# Altium footprint library mmyLibrary.PcbLib: 231 footprints (part 2 of 15)
Each footprint in its own frame and in the unit in brackets; x right, y up, seen from the top. Pads: shape width x height; smd on the part's side, far side on the other; paste and mask are expansions set on the pad; w line width, h text height; cw(c..) or ccw(c..) is an arc to the next point about the centre after c.
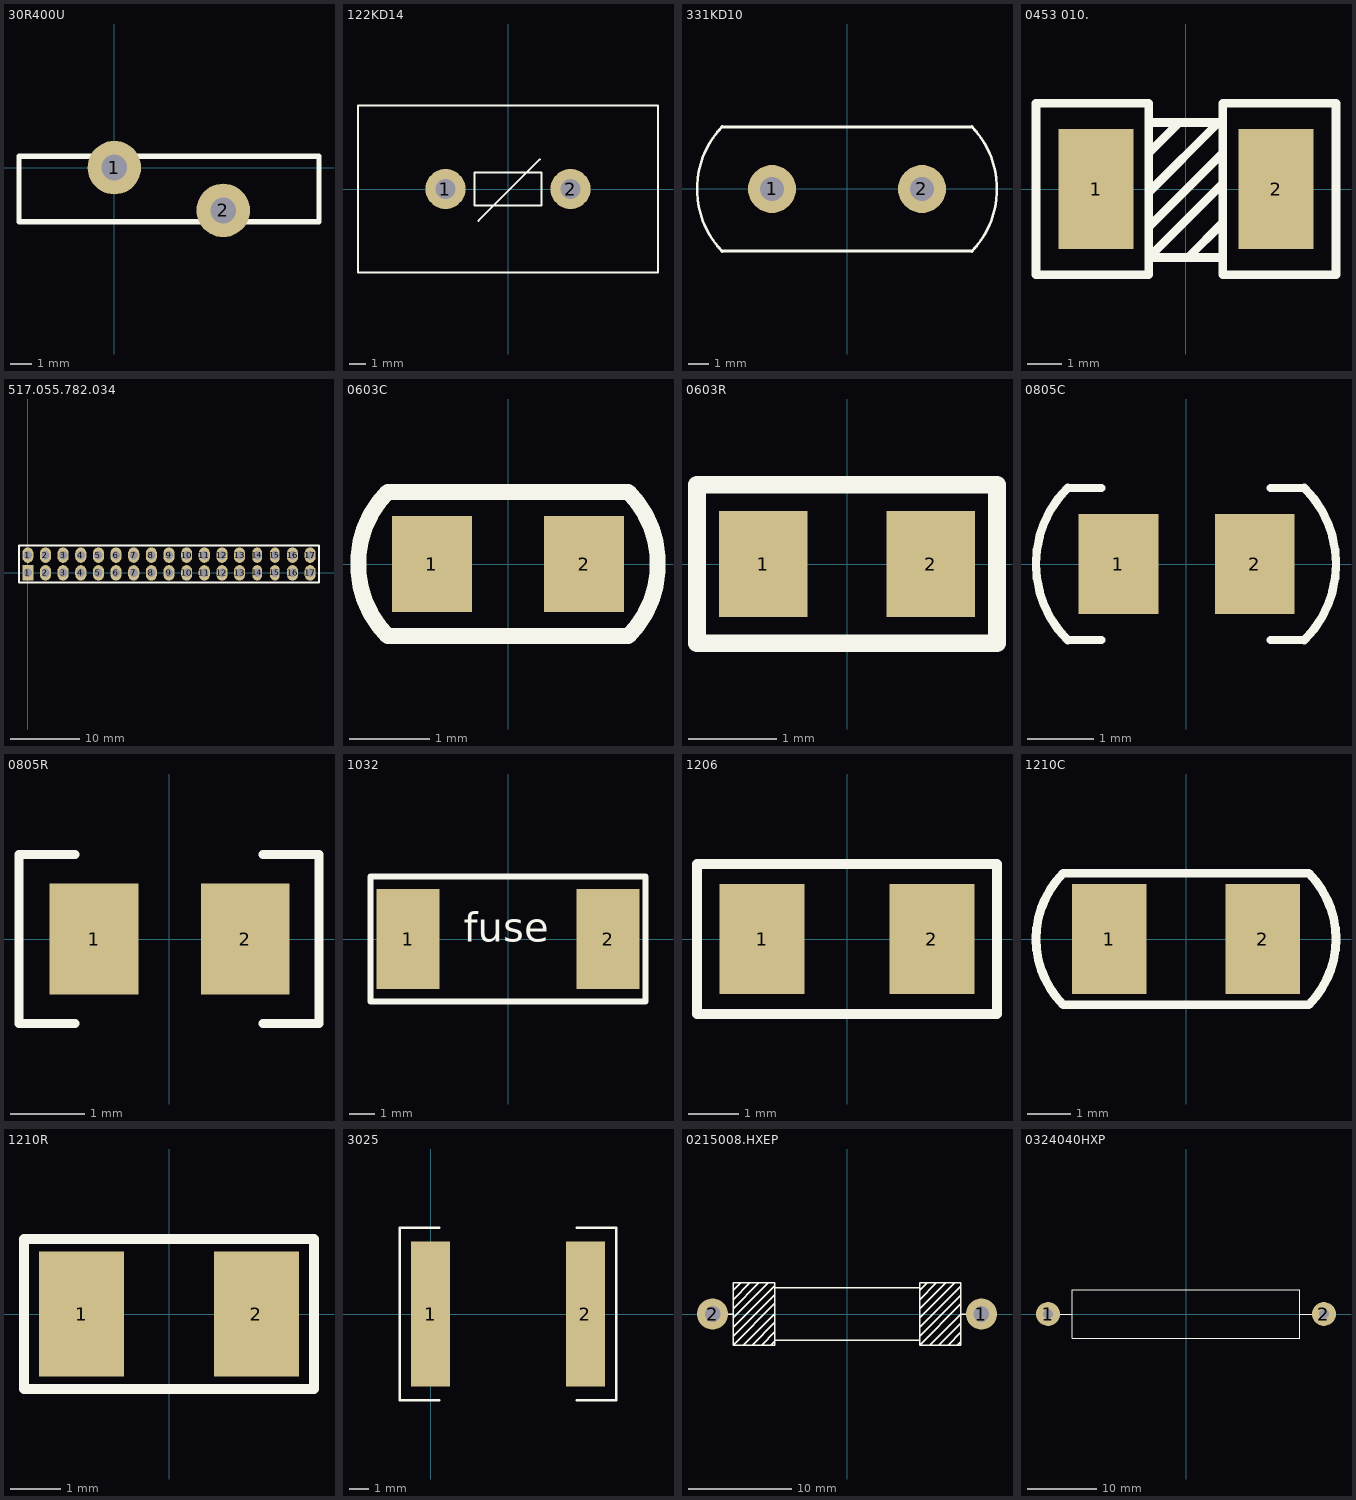
[diagram p1: the footprints below, top view; thin cyan lines are the x and y axes]

## 30R400U [mm]
pads (2):
  round 2.5 hole 1.2: 1(0,0) 2(5.08,-2)
Top Overlay:
  lines w0.254: -4.45,-2.53 -4.45,0.53 9.55,0.53 9.55,-2.53 -4.45,-2.53

## 122KD14 [mm] "压敏电阻D16.5mm*T9.0mm*P7.5mm上海君耀"
height 21
pads (2):
  round 2.4 hole 1.2: 1(-3.75,0) 2(3.75,0)
Top Overlay:
  lines w0.127: -1.778,-1.905 1.905,1.778 ; -9,-5 9,-5 9,5 -9,5 -9,-5 ; -2,-1 -2,1 2,1 2,-1 -2,-1

## 331KD10 [mm]
pads (2):
  round 2.4 hole 1.2: 1(-3.75,0) 2(3.75,0)
Top Overlay:
  lines w0.127: -6.25,-3.1 6.25,-3.1 ; -6.25,3.1 6.25,3.1 ; -6.237,-3.126 cw(c-3,0) -6.237,3.126 ; 6.237,-3.126 ccw(c3,0) 6.237,3.126

## 0453 010. [mm]
pads (2):
  rect 2.2x3.5 smd: 1(-2.625,0) 2(2.625,0)
Top Overlay:
  lines w0.254: -1.085,-1.111 1.074,1.048 ; -1.085,-0.095 0.947,1.937 ; -1.085,1.048 -0.196,1.937 ; -1.085,1.937 1.074,1.937 ; 0.058,-2 1.074,-0.984 ; 1.074,-2 -1.085,-2 1.074,0.159 ; -4.375,-2.5 -1.085,-2.5 -1.085,2.5 -4.375,2.5 -4.375,-2.5 ; 1.074,-2.5 4.375,-2.5 4.375,2.5 1.074,2.5 1.074,-2.5

## 517.055.782.034 [mm]
pads (34):
  rect 1.6x2.2 hole 1.2: 1(0,0)
  oval 1.6x2.2 hole 1.2: 1(0,2.54) 2(2.54,0) 2(2.54,2.54) 3(5.08,0) 3(5.08,2.54) 4(7.62,0) 4(7.62,2.54) 5(10.16,0) 5(10.16,2.54) 6(12.7,0) 6(12.7,2.54) 7(15.24,0) 7(15.24,2.54) 8(17.78,0) 8(17.78,2.54) 9(20.32,0) 9(20.32,2.54) 10(22.86,0) 10(22.86,2.54) 11(25.4,0) 11(25.4,2.54) 12(27.94,0) 12(27.94,2.54) 13(30.48,0) 13(30.48,2.54) 16(38.1,0) 16(38.1,2.54) 17(40.64,0) 17(40.64,2.54)
  oval 1.4x2.2 hole 1.2: 14(33.02,0) 14(33.02,2.54) 15(35.56,0) 15(35.56,2.54)
Top Overlay:
  lines w0.254: -1.27,-1.38 41.91,-1.38 41.91,3.92 -1.27,3.92 -1.27,-1.38

## 0603C [mm]
pads (2):
  rect 1x1.2 smd: 1(-0.95,0) 2(0.95,0)
Top Overlay:
  lines w0.2: -1.5,-0.9 cw(c-0.6,0) -1.5,0.9 1.5,0.9 cw(c0.6,0) 1.5,-0.9 -1.5,-0.9
3D body "CircuitWorks-CAPACITOR 0603.STEP": height 0.83, standoff -0.03, extent -0.8,-0.43 0.8,0.43

## 0603R [mm]
pads (2):
  rect 1x1.2 smd: 1(-0.95,0) 2(0.95,0)
Top Overlay:
  lines w0.2: -1.7,-0.9 1.7,-0.9 1.7,0.9 -1.7,0.9 -1.7,-0.9
3D body "CircuitWorks-RESISTOR 0603.STEP": height 0.48, standoff -0.03, extent -0.8,-0.43 0.8,0.43

## 0805C [mm]
pads (2):
  rect 1.2x1.5 smd: 1(-1.016,0) 2(1.032,0)
Top Overlay:
  lines w0.12: -1.778,-1.143 -1.27,-1.143 ; -1.778,1.143 -1.27,1.143 ; 1.27,-1.143 1.778,-1.143 ; 1.27,1.143 1.778,1.143
  lines w0.127: -1.778,-1.143 cw(c-0.635,0) -1.778,1.143 ; 1.778,-1.143 ccw(c0.635,0) 1.778,1.143
3D body "User Library-c0805-3.STEP": height 1.28, standoff -0.01, extent -1,-0.645 1,0.645

## 0805R [mm]
pads (2):
  rect 1.2x1.5 smd: 1(-1.016,0) 2(1.032,0)
Top Overlay:
  lines w0.12: -1.27,-1.143 -2.032,-1.143 -2.032,1.143 -1.27,1.143 ; 1.27,-1.143 2.032,-1.143 2.032,1.143 1.27,1.143
3D body "User Library-Res-0805.STEP": height 0.53, standoff 0, extent -1,-0.625 1,0.625

## 1032 [mm]
pads (2):
  rect 2.5x4 smd: 1(-4,0) 2(4,0)
Top Overlay:
  lines w0.254: -5.5,-2.5 -5.5,2.5 5.5,2.5 5.5,-2.5 -5.5,-2.5
  text "fuse" at -1.778,-0.508 h2

## 1206 [mm]
pads (2):
  rect 1.7x2.2 smd: 1(-1.7,0) 2(1.7,0)
Top Overlay:
  lines w0.2: -3,-1.5 -3,1.5 3,1.5 3,-1.5 -3,-1.5

## 1210C [mm]
pads (2):
  rect 1.7x2.5 smd: 1(-1.75,0) 2(1.75,0)
Top Overlay:
  lines w0.2: -2.8,-1.5 cw(c-1.3,0) -2.8,1.5 2.8,1.5 cw(c1.3,0) 2.8,-1.5 -2.8,-1.5

## 1210R [mm]
pads (2):
  rect 1.7x2.5 smd: 1(-1.75,0) 2(1.75,0)
Top Overlay:
  lines w0.2: -2.9,-1.5 2.9,-1.5 2.9,1.5 -2.9,1.5 -2.9,-1.5

## 3025 [mm]
pads (2):
  rect 2x7.5 smd: 1(0,0) 2(8,0)
Top Overlay:
  lines w0.127: 0.444,-4.445 -1.588,-4.445 -1.588,4.445 0.444,4.445 ; 7.556,-4.445 9.588,-4.445 9.588,4.445 7.556,4.445

## 0215008.HXEP [mm]
pads (2):
  round 3 hole 1.5: 1(13,0) 2(-13,0)
Top Overlay:
  lines w0.127: -13,0 -11,0 ; -11,-2.159 -6.985,1.856 ; -11,-1.27 -6.985,2.745 ; -11,-0.381 -7.619,3 ; -11,0.508 -8.509,2.999 ; -11,1.397 -9.397,3 ; -11,2.286 -10.287,2.999 ; -10.033,-3 -6.985,0.048 ; -9.144,-3 -7.009,-0.865 ; -8.255,-3 -6.985,-1.73 ; -7.366,-3 -6.985,-2.619 ; -6.985,-2.54 6.985,-2.54 ; -6.985,1.015 -11,-3 ; -6.985,2.54 6.985,2.54 ; 7.034,-2.159 10.986,1.793 ; 7.034,-1.27 10.986,2.682 ; 7.034,-0.381 10.415,3 ; 7.034,0.508 9.525,2.999 ; 7.034,1.397 8.637,3 ; 7.034,2.286 7.747,2.999 ; 8.001,-3 11.001,0 13,0 ; 8.89,-3 11.001,-0.889 ; 9.779,-3 11.001,-1.778 ; 10.668,-3 11.001,-2.667 ; 10.961,0.928 7.034,-3 ; -11,-3 -11,3 -6.985,3 -6.985,-3 -11,-3 ; 7.034,-3 11,-3 11,3 7.034,3 7.034,-3

## 0324040HXP [mm] "7*33mm/引线立式/LITTLEFUSE"
pads (2):
  round 3.5 hole 1.5: 1(-20,0) 2(20,0)
Top Overlay:
  lines w0.127: -20.066,0 -16.51,0 ; 16.51,0 19.431,0 ; -16.5,-3.5 -16.5,3.5 16.5,3.5 16.5,-3.5 -16.5,-3.5